# Altium footprint library ARCOM_Connectors.PcbLib: 84 footprints (part 4 of 6)
Each footprint in its own frame and in the unit in brackets; x right, y up, seen from the top. Pads: shape width x height; smd on the part's side, far side on the other; paste and mask are expansions set on the pad; w line width, h text height; cw(c..) or ccw(c..) is an arc to the next point about the centre after c.
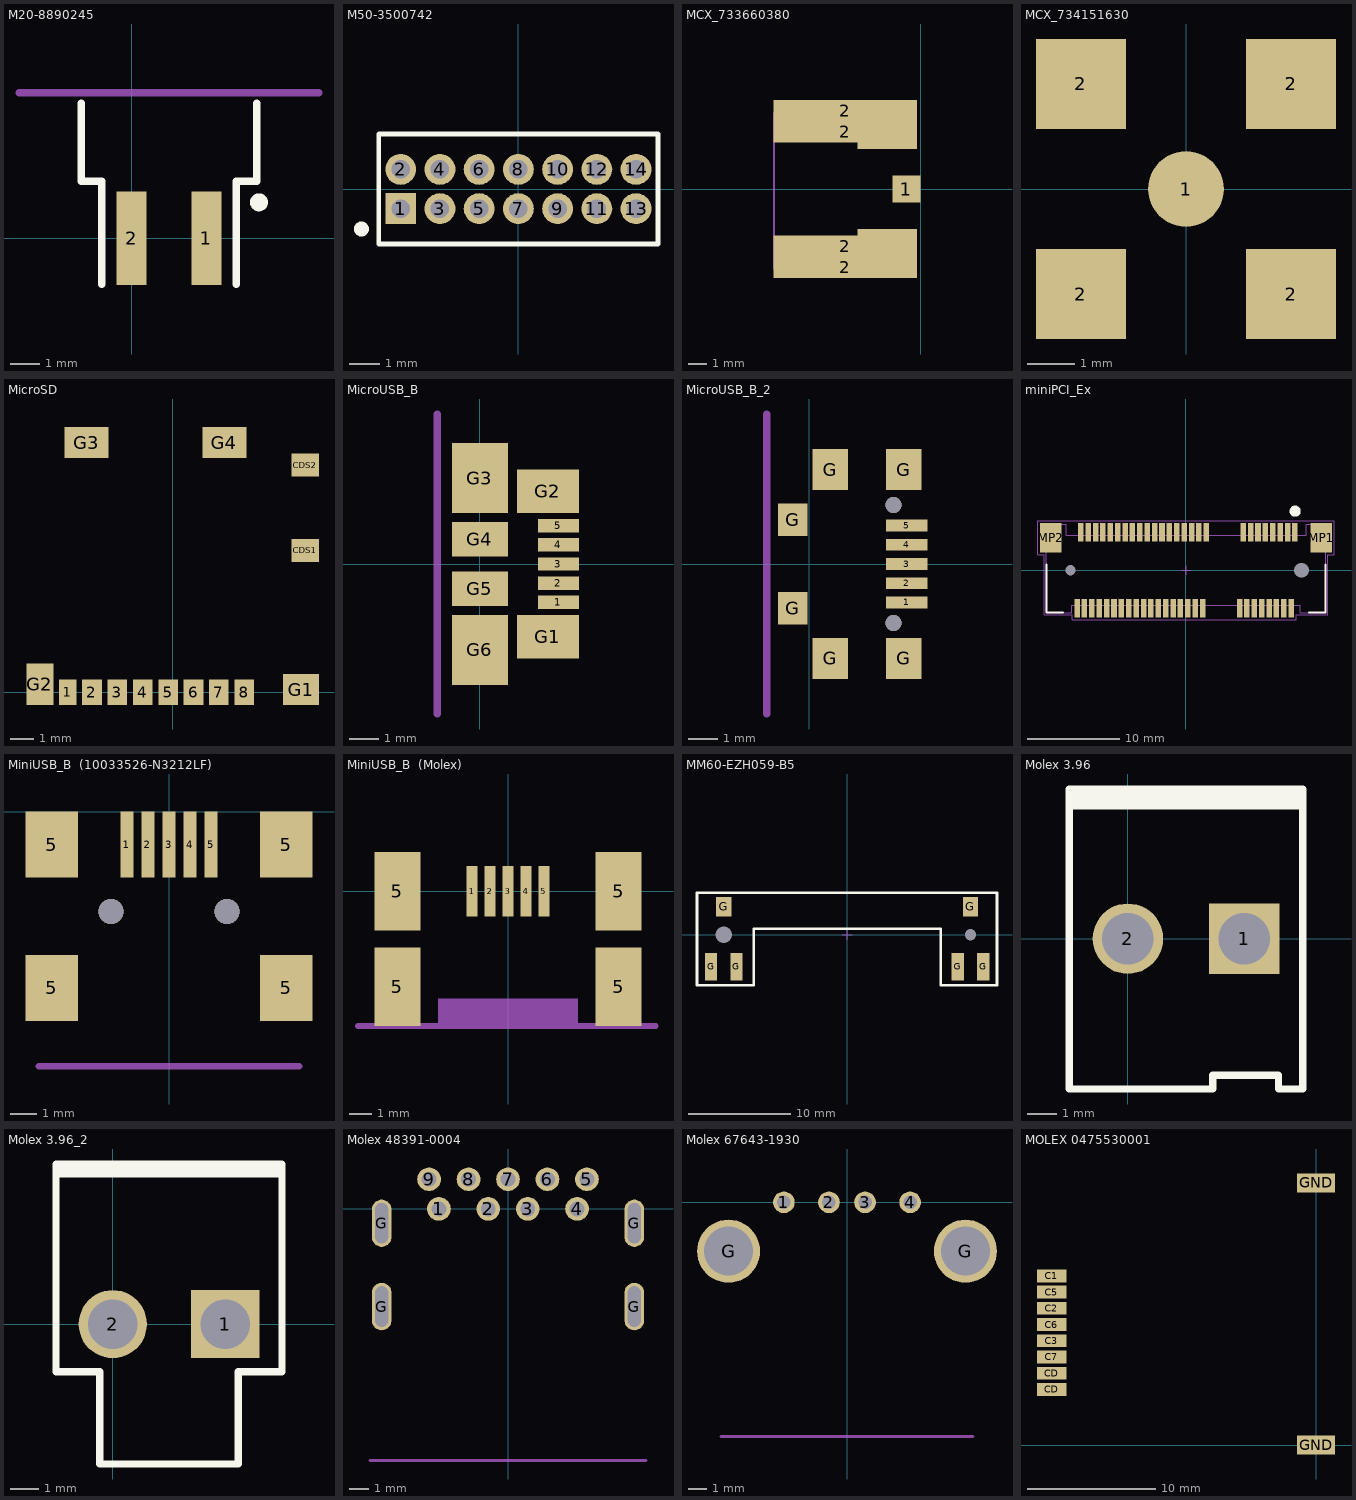
[diagram p3: the footprints below, top view; thin cyan lines are the x and y axes]

## M20-8890245 [mm]
pads (2):
  rect 1.02x3.17 smd: 1(2.54,0) 2(0,0)
Top Overlay:
  circle w0.305: c4.318,1.219 r0.152
  lines w0.254: -1.702,4.572 -1.702,1.93 -1.016,1.93 -1.016,-1.549 ; 3.556,-1.549 3.556,1.93 4.242,1.93 4.242,4.572
Mechanical 1:
  lines w0.254: -3.81,4.928 -1.27,4.928 1.27,4.928 3.81,4.928 6.35,4.928
  text "Board Edge" at -1.575,5.385 h0.64

## M50-3500742 [mm]
pads (14):
  rect 1x1 hole 0.6: 1(-3.81,-0.635)
  round 1 hole 0.6: 2(-3.81,0.635) 3(-2.54,-0.635) 4(-2.54,0.635) 5(-1.27,-0.635) 6(-1.27,0.635) 7(0,-0.635) 8(0,0.635) 9(1.27,-0.635) 10(1.27,0.635) 11(2.54,-0.635) 12(2.54,0.635) 13(3.81,-0.635) 14(3.81,0.635)
Top Overlay:
  circle w0.254: c-5.08,-1.295 r0.114
  lines w0.152: -4.521,-1.778 4.521,-1.778 4.521,1.778 -4.521,1.778 -4.521,-1.778
3D body "m50-3500742_asm.stp": height 4.02, standoff -2.28, extent -4.445,-1.702 4.445,1.698

## MCX_733660380 [mm]
pads (7):
  rect 1.5x1.45 smd mask+0: 1(-0.75,0)
  rect 7.62x1.15 smd mask+0: 2(-4.01,3.05) 2(-4.01,4.168) 2(-4.01,-4.168) 2(-4.01,-3.05)
  rect 3.15x0.35 smd mask+0: 2(-1.775,-2.3) 2(-1.775,2.3)
Mechanical 13:
  lines w0.102: -7.798,-4.267 -7.798,4.039
3D body "252151_75_3d_model.STEP": height 2.83, standoff -2.17, extent -9.781,-3.353 -0.481,3.346

## MCX_734151630 [mm]
pads (5):
  round 1.6 smd mask+0: 1(0,0)
  rect 1.9x1.9 smd mask+0: 2(-2.22,-2.22) 2(-2.22,2.22) 2(2.22,-2.22) 2(2.22,2.22)
3D body "Molex_73415-1630.STEP": height 6.35, standoff 0, extent -2.996,-2.921 2.894,2.969

## MicroSD [mm]
pads (14):
  rect 0.75x1.1 smd: 1(-4.545,0)
  rect 0.85x1.1 smd: 2(-3.495,0) 3(-2.395,0) 4(-1.295,0) 5(-0.195,0) 6(0.905,0) 7(2.005,0) 8(3.105,0)
  rect 1.2x1 smd: CDS1(5.74,6.15) CDS2(5.74,9.85)
  rect 1.55x1.35 smd: G1(5.565,0.125)
  rect 1.17x1.8 smd: G2(-5.755,0.35)
  rect 1.9x1.35 smd: G3(-3.73,10.825) G4(2.24,10.825)
3D body "1040310811.stp": height 1.48, standoff 0.03, extent -5.981,-0.264 5.969,11.136

## MicroUSB_B [mm]
pads (11):
  rect 1.38x0.45 smd: 1(2.66,-1.3) 2(2.66,-0.65) 3(2.66,0) 4(2.66,0.65) 5(2.66,1.3)
  rect 2.1x1.475 smd: G1(2.3,-2.462) G2(2.3,2.462)
  rect 1.9x2.375 smd: G3(0,2.913) G6(0,-2.913)
  rect 1.9x1.175 smd: G4(0,0.837) G5(0,-0.837)
Mechanical 1:
  lines w0.254: -1.45,-5.08 -1.45,5.08
3D body "473460001.stp": height 2.69, standoff -0.25, extent -2.577,-3.99 2.853,3.99

## MicroUSB_B_2 [mm]
pads (11):
  rect 1.4x0.4 smd: 1(3.295,-1.3) 2(3.295,-0.65) 3(3.295,0) 4(3.295,0.65) 5(3.295,1.3)
  rect 1x1.1 smd: G(-0.559,-1.5) G(-0.559,1.5)
  rect 1.2x1.4 smd: G(0.7,-3.2) G(0.7,3.2) G(3.2,-3.2) G(3.2,3.2)
via 2.85,2 diameter 0.55 hole 0.55
via 2.85,-2 diameter 0.55 hole 0.55
Mechanical 1:
  lines w0.254: -1.45,-5.08 -1.45,5.08
3D body "473460001.stp": height 2.69, standoff -0.25, extent -2.577,-3.99 2.853,3.99

## miniPCI_Ex [mm]
pads (56):
  rect 0.6x2 smd: 1(11.803,4.106) 2(11.403,-4.094) 3(11.003,4.106) 4(10.603,-4.094) 5(10.203,4.106) 6(9.803,-4.094) 7(9.403,4.106) 8(9.003,-4.094) 9(8.603,4.106) 10(8.203,-4.094) 11(7.803,4.106) 12(7.403,-4.094) 13(7.003,4.106) 14(6.603,-4.094) 15(6.203,4.106) 16(5.803,-4.094) 17(2.203,4.106) 18(1.803,-4.094) 19(1.403,4.106) 20(1.003,-4.094) 21(0.603,4.106) 22(0.203,-4.094) 23(-0.197,4.106) 24(-0.597,-4.094) 25(-0.997,4.106) 26(-1.397,-4.094) 27(-1.797,4.106) 28(-2.197,-4.094) 29(-2.597,4.106) 30(-2.997,-4.094) 31(-3.397,4.106) 32(-3.797,-4.094) 33(-4.197,4.106) 34(-4.597,-4.094) 35(-4.997,4.106) 36(-5.397,-4.094) 37(-5.797,4.106) 38(-6.197,-4.094) 39(-6.597,4.106) 40(-6.997,-4.094) 41(-7.397,4.106) 42(-7.797,-4.094) 43(-8.197,4.106) 44(-8.597,-4.094) 45(-8.997,4.106) 46(-9.397,-4.094) 47(-9.797,4.106) 48(-10.197,-4.094) 49(-10.597,4.106) 50(-10.997,-4.094) 51(-11.397,4.106) 52(-11.797,-4.094)
  round 1.3 hole 1.6 unplated: MH1(12.503,0.006)
  round 0.8 hole 1.1 unplated: MH2(-12.497,0.006)
  rect 2.3x3.2 smd: MP1(14.653,3.506) MP2(-14.647,3.506)
Top Overlay:
  circle w0.6: c11.818,6.393 r0.3
  lines w0.2: -15.122,-4.594 -13.326,-4.594 ; -15.122,-4.529 -15.122,0.65 ; 13.341,-4.594 14.91,-4.594 15.128,-4.594 15.128,0.639
Mechanical 13:
  lines w0.1: -15.122,3.802 -15.122,-4.529 -15.122,-4.594 -12.372,-4.594 -12.372,-3.795 12.378,-3.794 ; -15.122,3.806 -14.022,3.806 ; -14.022,3.81 -14.022,4.991 -14.007,5.006 -12.997,5.006 -12.997,3.806 13.003,3.806 13.003,5.006 14.03,5.006 ; 12.378,-4.594 14.91,-4.594 15.128,-4.594 15.128,3.803 ; 12.378,-4.594 12.378,-3.793 ; 14.028,3.806 15.128,3.806 ; 14.028,3.828 14.028,5.006
M15 Top Assy:
  lines w0.1: -0.497,0.006 0.503,0.006 ; 0.003,-0.494 0.003,0.506 ; -16.047,1.656 -15.372,1.656 -15.372,-4.844 -12.347,-4.844 -12.347,-5.344 11.953,-5.344 11.953,-4.844 15.378,-4.844 15.378,1.656 16.053,1.656 16.053,5.356 -16.047,5.356 -16.047,1.656
3D body: height 0.82, standoff 0.2, extent -14.997,-4.494 -12.347,-3.794
3D body: height 0.82, standoff 0.2, extent -14.997,-4.494 -14.997,-4.494
3D body: height 0.82, standoff 0.2, extent 12.353,-4.494 15.003,-3.694
3D body: height 1.34, standoff 0.69, extent -13.787,3.706 -12.097,4.256
3D body: height 1.34, standoff 0.69, extent 12.103,3.706 13.793,4.256
3D body: height 5.6, standoff 4.54, extent 12.103,3.706 13.793,5.006
3D body: height 5.6, standoff 4.54, extent -13.787,3.706 -12.097,5.006
3D body: height 5.6, standoff 3.12, extent -14.997,-3.671 15.003,3.706
3D body: height 3.12, standoff 0, extent -14.997,-3.794 15.003,3.706

## MiniUSB_B  (10033526-N3212LF) [mm]
pads (9):
  rect 0.5x2.5 smd: 1(-1.6,-1.25) 2(-0.8,-1.25) 3(0,-1.25) 4(0.8,-1.25) 5(1.6,-1.25)
  rect 2x2.5 smd: 5(-4.45,-6.7) 5(-4.45,-1.25) 5(4.45,-6.7) 5(4.45,-1.25)
via 2.2,-3.8 diameter 0.95 hole 0.95
via -2.2,-3.8 diameter 0.95 hole 0.95
Mechanical 1:
  lines w0.254: -4.95,-9.68 4.95,-9.68
3D body "i10033526-xxx1x.STEP": height 4.04, standoff -0.96, extent -4.95,-9.646 4.95,-0.246

## MiniUSB_B  (Molex) [mm]
pads (9):
  rect 0.5x2.25 smd: 1(-1.6,0) 2(-0.8,0) 3(0,0) 4(0.8,0) 5(1.6,0)
  rect 2.05x3.5 smd: 5(-4.925,-4.25) 5(-4.925,0) 5(4.925,-4.25) 5(4.925,0)
Mechanical 1:
  pour cut-out: -3.1,-5.994 -3.1,-4.775 3.1,-4.775 3.1,-5.994
  lines w0.254: -6.68,-5.994 6.579,-5.994
3D body "548190572.STEP": height 4.08, standoff 0.03, extent -4.95,-8.23 4.95,0.77

## MM60-EZH059-B5 [mm]
pads (8):
  rect 1.2x2.7 smd: G(-13.35,-3.15) G(-10.866,-3.15) G(10.85,-3.144) G(13.35,-3.144)
  rect 1.5x1.9 smd: G(-12.1,2.75) G(12.1,2.75)
  round 1.3 hole 1.6 unplated: MH1(-12.1,0)
  round 0.8 hole 1.1 unplated: MH2(12.1,0.006)
Top Overlay:
  lines w0.254: -14.732,-4.953 -9.169,-4.953 -9.169,0.584 9.169,0.584 9.169,-4.953 14.707,-4.953 14.707,4.14 -14.732,4.14 -14.732,-4.953
M15 Top Assy:
  lines w0.1: -0.497,0.006 0.503,0.006 ; 0.003,-0.494 0.003,0.506
3D body "K3D-MM60-EZH059-B5-R2 JAE Connector Division Proprietary.STEP": height 6.7, standoff -0.9, extent -14.475,-3.95 14.525,3.95

## Molex 3.96 [mm] "Molex A-41791-0002 (26-60-4020)"
pads (2):
  rect 2.4x2.4 hole 1.75: 1(3.96,0)
  round 2.4 hole 1.75: 2(0,0)
Top Overlay:
  lines w0.254: -2,4.521 5.833,4.521 ; -2,4.699 5.757,4.699 5.935,4.877 -2,4.877 ; -2,-5.12 -2,0 -2,5.1 5.96,5.1 5.96,0 5.96,-5.12 5.131,-5.12 5.131,-4.648 2.896,-4.648 2.896,-5.12 -2,-5.12

## Molex 3.96_2 [mm] "Molex A-41791-0002 (26-60-4020)"
pads (2):
  rect 2.4x2.4 hole 1.75: 1(3.96,0)
  round 2.4 hole 1.75: 2(0,0)
Top Overlay:
  lines w0.254: -2,5.283 5.833,5.283 ; -2,5.461 5.757,5.461 ; 5.935,5.639 -2,5.639 -2,0 -2,-1.676 -0.46,-1.676 -0.46,-4.928 4.42,-4.928 4.42,-1.676 5.96,-1.676 5.96,0 5.96,5.639
3D body "026604020.stp": height 14.86, standoff -3.43, extent -1.905,-4.908 5.867,5.099

## Molex 48391-0004 [mm]
pads (13):
  round 1.2 hole 0.75: 1(-3.5,0) 2(-1,0) 3(1,0) 4(3.5,0) 5(4,1.5) 6(2,1.5) 7(0,1.5) 8(-2,1.5) 9(-4,1.5)
  rrect100% 1x2.4 hole 0.65 slot 2.05 at 90 deg: G(-6.4,-4.95) G(-6.4,-0.725) G(6.4,-4.95) G(6.4,-0.725)
Mechanical 1:
  lines w0.152: -6.985,-12.75 6.985,-12.75
3D body "483910004.stp": height 9.06, standoff -1.47, extent -6.883,-12.732 6.917,2.368

## Molex 67643-1930 [mm]
pads (6):
  round 1.2 hole 0.75: 1(-3.5,0) 2(-1,0) 3(1,0) 4(3.5,0)
  round 3.5 hole 2.72: G(-6.57,-2.71) G(6.57,-2.71)
Mechanical 1:
  lines w0.152: -6.985,-12.99 6.985,-12.99
3D body "676431930.stp": height 7.73, standoff -3.7, extent -7.998,-12.989 8.001,2.271

## MOLEX 0475530001 [mm]
pads (10):
  rect 2.3x1 smd: C1(-20.7,13.26) C2(-20.7,10.72) C3(-20.7,8.18) C5(-20.7,11.99) C6(-20.7,9.45) C7(-20.7,6.91) CD(-20.7,5.64) CD(-20.7,4.37)
  rect 2.95x1.5 smd: GND(0,0) GND(0,20.55)
3D body "475530001.stp": height 1.94, standoff 0.11, extent -21.226,-0.173 5.274,20.777